# Altium footprint library HW_HOLLAND_NCDM_MONITOR_R1.PcbLib: 472 footprints (part 2 of 30)
Each footprint in its own frame and in the unit in brackets; x right, y up, seen from the top. Pads: shape width x height; smd on the part's side, far side on the other; paste and mask are expansions set on the pad; w line width, h text height; cw(c..) or ccw(c..) is an arc to the next point about the centre after c.
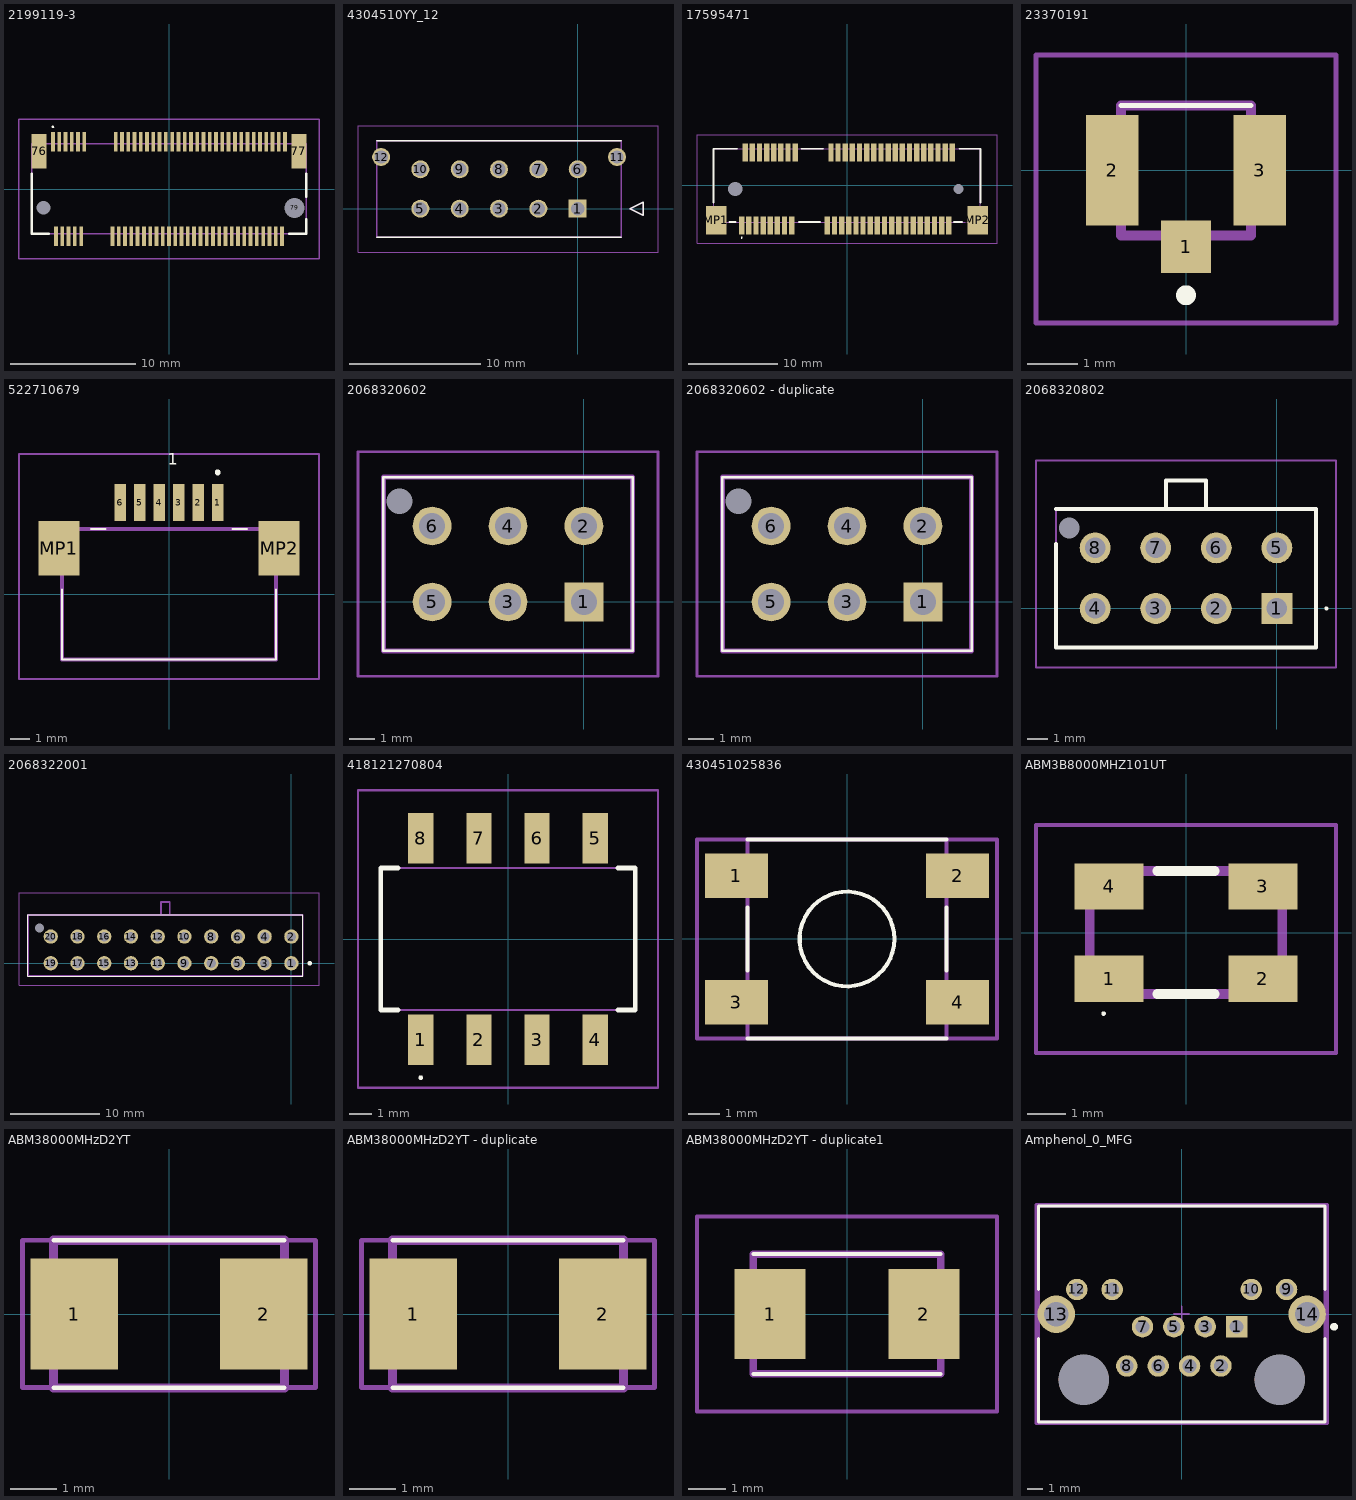
[diagram p1: the footprints below, top view; thin cyan lines are the x and y axes]

## 2199119-3 [mm]
pads (71):
  rect 0.3x1.55 smd: 1(-9.25,3.775) 2(-9,-3.775) 3(-8.75,3.775) 4(-8.5,-3.775) 5(-8.25,3.775) 6(-8,-3.775) 7(-7.75,3.775) 8(-7.5,-3.775) 9(-7.25,3.775) 10(-7,-3.775) 11(-6.75,3.775) 20(-4.5,-3.775) 21(-4.25,3.775) 22(-4,-3.775) 23(-3.75,3.775) 24(-3.5,-3.775) 25(-3.25,3.775) 26(-3,-3.775) 27(-2.75,3.775) 28(-2.5,-3.775) 29(-2.25,3.775) 30(-2,-3.775) 31(-1.75,3.775) 32(-1.5,-3.775) 33(-1.25,3.775) 34(-1,-3.775) 35(-0.75,3.775) 36(-0.5,-3.775) 37(-0.25,3.775) 38(0,-3.775) 39(0.25,3.775) 40(0.5,-3.775) 41(0.75,3.775) 42(1,-3.775) 43(1.25,3.775) 44(1.5,-3.775) 45(1.75,3.775) 46(2,-3.775) 47(2.25,3.775) 48(2.5,-3.775) 49(2.75,3.775) 50(3,-3.775) 51(3.25,3.775) 52(3.5,-3.775) 53(3.75,3.775) 54(4,-3.775) 55(4.25,3.775) 56(4.5,-3.775) 57(4.75,3.775) 58(5,-3.775) 59(5.25,3.775) 60(5.5,-3.775) 61(5.75,3.775) 62(6,-3.775) 63(6.25,3.775) 64(6.5,-3.775) 65(6.75,3.775) 66(7,-3.775) 67(7.25,3.775) 68(7.5,-3.775) 69(7.75,3.775) 70(8,-3.775) 71(8.25,3.775) 72(8.5,-3.775) 73(8.75,3.775) 74(9,-3.775) 75(9.25,3.775)
  rect 1.2x2.75 smd: 76(-10.35,3) 77(10.35,3)
  round 0.55 hole 1.1 unplated: 78(-10,-1.5)
  round 0.8 hole 1.6 unplated: 79(10,-1.5)
Top Overlay:
  lines w0.1: -9.25,4.9 cw(c-9.25,4.95) -9.25,5 cw(c-9.25,4.95) -9.25,4.9
  lines w0.2: -10.925,1.2 -10.925,-3.55 -9.6,-3.55 ; 9.6,-3.55 10.925,-3.55 10.925,-2.4 ; 10.925,-0.6 10.925,1.2
Mechanical 13:
  lines w0.1: -10.925,-3.55 -10.925,3.6 10.925,3.6 10.925,-3.55 -10.925,-3.55
Mechanical 15:
  lines w0.1: -11.95,-5.55 -11.95,5.55 11.95,5.55 11.95,-5.55 -11.95,-5.55
3D body "EM05--3DModel-STEP-269445.STEP": height 3.8, standoff 1.5, extent -15,-41.416 15,0.584
3D body "Conn_TE_Connectivity_2199119-3_eec.STEP": height 0.25, standoff 0, extent -11.1,-4.65 11.1,4.65

## 4304510YY_12 [mm]
pads (12):
  rect 1.37x1.37 / inner round 1.37 / far side rect 1.37x1.37 hole 1.02 mask+0.076: 1(0,0)
  round 1.37 hole 1.02 mask+0.076: 2(-3,0) 3(-6,0) 4(-9,0) 5(-12,0) 6(0,3) 7(-3,3) 8(-6,3) 9(-9,3) 10(-12,3) 11(3,3.94) 12(-15,3.94)
Top Overlay:
  lines w0.127: -15.325,-2.185 3.325,-2.185 ; -15.325,5.185 3.325,5.185 ; 4,0 5,0.5 5,-0.5 4,0
Mechanical 15:
  lines w0.127: -15.325,-2.185 -15.325,5.185 3.325,5.185 3.325,-2.185 -15.325,-2.185 ; 4,0 5,0.5 5,-0.5 4,0
Mechanical 20:
  lines w0.05: -16.761,-3.312 -16.761,6.312 6.127,6.312 6.127,-3.312 -16.761,-3.312
3D body "430451012.stp": height 9.95, standoff -3.14, extent -15.575,-2.47 3.575,6.3

## 17595471 [mm]
pads (56):
  rect 0.6x2 smd: 1(-11.8,-4.5) 2(-11.4,3.7) 3(-11,-4.5) 4(-10.6,3.7) 5(-10.2,-4.5) 6(-9.8,3.7) 7(-9.4,-4.5) 8(-9,3.7) 9(-8.6,-4.5) 10(-8.2,3.7) 11(-7.8,-4.5) 12(-7.4,3.7) 13(-7,-4.5) 14(-6.6,3.7) 15(-6.2,-4.5) 16(-5.8,3.7) 17(-2.2,-4.5) 18(-1.8,3.7) 19(-1.4,-4.5) 20(-1,3.7) 21(-0.6,-4.5) 22(-0.2,3.7) 23(0.2,-4.5) 24(0.6,3.7) 25(1,-4.5) 26(1.4,3.7) 27(1.8,-4.5) 28(2.2,3.7) 29(2.6,-4.5) 30(3,3.7) 31(3.4,-4.5) 32(3.8,3.7) 33(4.2,-4.5) 34(4.6,3.7) 35(5,-4.5) 36(5.4,3.7) 37(5.8,-4.5) 38(6.2,3.7) 39(6.6,-4.5) 40(7,3.7) 41(7.4,-4.5) 42(7.8,3.7) 43(8.2,-4.5) 44(8.6,3.7) 45(9,-4.5) 46(9.4,3.7) 47(9.8,-4.5) 48(10.2,3.7) 49(10.6,-4.5) 50(11,3.7) 51(11.4,-4.5) 52(11.8,3.7)
  round 0.8 hole 1.6 unplated: MH1(-12.5,-0.4)
  round 0.55 hole 1.1 unplated: MH2(12.5,-0.4)
  rect 2.3x3.2 smd: MP1(-14.65,-3.9) MP2(14.65,-3.9)
Top Overlay:
  lines w0.1: -11.8,-5.9 cw(c-11.8,-5.85) -11.8,-5.8 cw(c-11.8,-5.85) -11.8,-5.9
  lines w0.2: -14.95,-1.9 -14.95,4.1 -12.3,4.1 ; -13.2,-4.1 -12.5,-4.1 ; -5.4,-4.1 -3,-4.1 ; -5.1,4.1 -2.7,4.1 ; 12,-4.1 12.9,-4.1 ; 12.6,4.1 14.95,4.1 14.95,-1.9
Mechanical 13:
  lines w0.1: -14.95,-4.1 14.95,-4.1 14.95,4.1 -14.95,4.1 -14.95,-4.1
Mechanical 15:
  lines w0.1: -16.8,-6.5 16.8,-6.5 16.8,5.7 -16.8,5.7 -16.8,-6.5
3D body "1759547-1.stp": height 7.01, standoff -0.64, extent -14.95,-5 14.95,4.1

## 23370191 [mm]
pads (3):
  rect 1x1.05 smd: 1(0,-1.525)
  rect 1.05x2.2 smd: 2(-1.475,0) 3(1.475,0)
Top Overlay:
  lines w0.1: -1.3,1.3 1.3,1.3
  lines w0.2: -0.1,-2.5 ccw(c0,-2.5) 0.1,-2.5 ccw(c0,-2.5) -0.1,-2.5
Mechanical 13:
  lines w0.2: -1.3,-1.3 1.3,-1.3 1.3,1.3 -1.3,1.3 -1.3,-1.3
Mechanical 15:
  lines w0.1: -3,-3.05 3,-3.05 3,2.3 -3,2.3 -3,-3.05
3D body "2337019-1.stp": height 1.25, standoff 0, extent -1.5,-1.46 1.5,1.64

## 522710679 [mm]
pads (8):
  rect 0.6x1.9 smd: 1(2.5,4.7) 2(1.5,4.7) 3(0.5,4.7) 4(-0.5,4.7) 5(-1.5,4.7) 6(-2.5,4.7)
  rect 2.1x2.8 smd: MP1(-5.65,2.35) MP2(5.65,2.35)
Top Overlay:
  lines w0.1: -5.5,-3.35 5.5,-3.35 ; -5.5,-3.35 5.5,-3.35 ; -5.5,-3.35 -5.5,0.25 -5.5,-3.35 ; 5.5,-3.35 5.5,0.25 5.5,-3.35 ; -4,3.35 -3.25,3.35 -4,3.35 ; 3.25,3.35 4,3.35 3.25,3.35
  lines w0.2: 2.5,6.2 cw(c2.5,6.25) 2.5,6.3 ; 2.5,6.2 ccw(c2.5,6.25) 2.5,6.3 ; 2.5,6.2 cw(c2.5,6.25) 2.5,6.3
  text "1" at -0.074,6.428 h1.02
Mechanical 13:
  lines w0.2: -5.5,-3.35 -5.5,3.35 5.5,3.35 5.5,-3.35 -5.5,-3.35
Mechanical 15:
  lines w0.1: -7.7,-4.35 -7.7,7.2 7.7,7.2 7.7,-4.35 -7.7,-4.35
3D body "52271-0679.stp": height 3, standoff 0, extent -6.5,-2.27 6.5,5.13

## 2068320602 [mm]
pads (7):
  rect 1.53x1.53 hole 1.02: 1(0,0)
  round 1.53 hole 1.02: 2(0,3) 3(-3,0) 4(-3,3) 5(-6,0) 6(-6,3)
  round 0.51 hole 1.02 unplated: MH1(-7.28,3.98)
Top Overlay:
  lines w0.1: -7.925,-1.93 1.925,-1.93 1.925,4.93 -7.925,4.93 -7.925,-1.93
Mechanical 15:
  lines w0.2: -7.925,-1.93 1.925,-1.93 1.925,4.93 -7.925,4.93 -7.925,-1.93
Mechanical 20:
  lines w0.1: -8.925,-2.93 2.925,-2.93 2.925,5.93 -8.925,5.93 -8.925,-2.93
3D body "206832-0602.stp": height 5.8, standoff -4.65, extent -10,-3.376 10,3.376

## 2068320602 - duplicate [mm]
pads (7):
  rect 1.53x1.53 hole 1.02: 1(0,0)
  round 1.53 hole 1.02: 2(0,3) 3(-3,0) 4(-3,3) 5(-6,0) 6(-6,3)
  round 0.51 hole 1.02 unplated: MH1(-7.28,3.98)
Top Overlay:
  lines w0.1: -7.925,-1.93 1.925,-1.93 1.925,4.93 -7.925,4.93 -7.925,-1.93
Mechanical 15:
  lines w0.2: -7.925,-1.93 1.925,-1.93 1.925,4.93 -7.925,4.93 -7.925,-1.93
Mechanical 20:
  lines w0.1: -8.925,-2.93 2.925,-2.93 2.925,5.93 -8.925,5.93 -8.925,-2.93
3D body "206832-0602.stp": height 5.8, standoff -4.65, extent -10,-3.376 10,3.376

## 2068320802 [mm]
pads (9):
  rect 1.53x1.53 hole 1.02: 1(0,0)
  round 1.53 hole 1.02: 2(-3,0) 3(-6,0) 4(-9,0) 5(0,3) 6(-3,3) 7(-6,3) 8(-9,3)
  round 0.51 hole 1.02 unplated: MH1(-10.28,3.98)
Top Overlay:
  lines w0.1: 2.4,0 cw(c2.45,0) 2.5,0 cw(c2.45,0) 2.4,0
  lines w0.2: -10.925,3.2 -10.925,-1.93 1.925,-1.93 1.925,4.93 -10.925,4.93 ; -5.5,4.93 -5.5,6.33 -3.5,6.33 -3.5,4.93
Mechanical 13:
  lines w0.1: -5.5,4.93 -5.5,6.33 -3.5,6.33 -3.5,4.93 ; -10.925,-1.93 -10.925,4.93 1.925,4.93 1.925,-1.93 -10.925,-1.93
Mechanical 15:
  lines w0.1: -11.925,-2.93 -11.925,7.33 2.925,7.33 2.925,-2.93 -11.925,-2.93
3D body "206832-0802.stp": height 9.8, standoff -3.28, extent -10.925,-1.93 1.925,6.33

## 2068322001 [mm]
pads (21):
  round 1.605 hole 1.07: 1(0,0) 2(0,3) 3(-3,0) 4(-3,3) 5(-6,0) 6(-6,3) 7(-9,0) 8(-9,3) 9(-12,0) 10(-12,3) 11(-15,0) 12(-15,3) 13(-18,0) 14(-18,3) 15(-21,0) 16(-21,3) 17(-24,0) 18(-24,3) 19(-27,0) 20(-27,3)
  round 0.51 hole 1.02 unplated: MH1(-28.28,3.98)
Top Overlay:
  lines w0.1: -29.565,-1.44 1.285,-1.44 1.285,5.42 -29.565,5.42 -29.565,-1.44
  lines w0.4: 2,0 ccw(c2.05,0) 2.1,0 ccw(c2.05,0) 2,0
Mechanical 13:
  lines w0.2: -14.64,5.49 -14.64,6.89 -13.64,6.89 -13.64,5.42 ; -29.565,-1.44 1.285,-1.44 1.285,5.42 -29.565,5.42 -29.565,-1.44
Mechanical 15:
  lines w0.1: -30.565,-2.44 3.1,-2.44 3.1,7.89 -30.565,7.89 -30.565,-2.44
3D body "2068322001--3DModel-STEP-361473.STEP": height 9.92, standoff -3.17, extent -28.925,-1.935 1.925,6.325

## 418121270804 [mm]
pads (8):
  rect 1.1x2.2 smd: 1(-3.81,-4.4) 2(-1.27,-4.4) 3(1.27,-4.4) 4(3.81,-4.4) 5(3.81,4.4) 6(1.27,4.4) 7(-1.27,4.4) 8(-3.81,4.4)
Top Overlay:
  lines w0.1: -3.81,-6.1 ccw(c-3.81,-6.05) -3.81,-6 ccw(c-3.81,-6.05) -3.81,-6.1
  lines w0.2: -4.8,-3.1 -5.55,-3.1 -5.55,3.1 -4.8,3.1 ; 4.8,-3.1 5.55,-3.1 5.55,3.1 4.8,3.1
Mechanical 13:
  lines w0.1: -5.55,-3.1 -5.55,3.1 5.55,3.1 5.55,-3.1 -5.55,-3.1
Mechanical 15:
  lines w0.1: -6.55,-6.5 -6.55,6.5 6.55,6.5 6.55,-6.5 -6.55,-6.5
3D body "418121270804.stp": height 4.32, standoff 0, extent -5.55,-4.9 5.55,4.9

## 430451025836 [mm]
pads (4):
  rect 2x1.4 smd: 1(-3.5,2) 2(3.5,2) 3(-3.5,-2) 4(3.5,-2)
Top Overlay:
  circle w0.127: c0,0 r1.5
  lines w0.127: -3.15,-3.15 3.15,-3.15 ; -3.15,-1 -3.15,1 ; -3.15,3.15 1.3,3.15 3.15,3.15 ; 3.15,-1 3.15,1
Mechanical 13:
  lines w0.127: -3.15,-3.15 3.15,-3.15 3.15,3.15 -3.15,3.15 -3.15,-3.15
Mechanical 15:
  lines w0.127: -4.75,-3.15 -4.75,3.15 4.75,3.15 4.75,-3.15 -4.75,-3.15
3D body "4304x10258x6.stp": height 2.49, standoff -0.01, extent -4,-3.1 4,3.1

## ABM3B8000MHZ101UT [mm]
pads (4):
  rect 1.8x1.2 smd: 1(-2,-1.2) 2(2,-1.2) 3(2,1.2) 4(-2,1.2)
Top Overlay:
  lines w0.059: -2.171,-2.106 ccw(c-2.141,-2.106) -2.111,-2.106 ccw(c-2.141,-2.106) -2.171,-2.106
  lines w0.254: -0.75,-1.6 0.75,-1.6 ; -0.75,1.6 0.75,1.6
Mechanical 13:
  lines w0.254: -2.5,-1.6 2.5,-1.6 2.5,1.6 -2.5,1.6 -2.5,-1.6
Mechanical 15:
  lines w0.1: -3.9,-3.136 3.9,-3.136 3.9,2.8 -3.9,2.8 -3.9,-3.136
3D body "ABM3B-25.000MHZ-D4Y-T.stp": height 1.1, standoff 0, extent -2.5,-1.6 2.5,1.6

## ABM38000MHzD2YT [mm]
height 3.5
pads (2):
  rect 1.9x2.4 smd: 1(-2.05,0) 2(2.05,0)
Top Overlay:
  lines w0.1: -2.5,-1.6 2.5,-1.6 ; -2.5,1.6 2.5,1.6
Mechanical 13:
  lines w0.2: -2.5,-1.6 2.5,-1.6 2.5,1.6 -2.5,1.6 -2.5,-1.6
Mechanical 15:
  lines w0.1: -3.175,-1.592 3.175,-1.592 3.175,1.603 -3.175,1.603 -3.175,-1.592
3D body "ABM3-8.000MHZ-B4Y-T.stp": height 1.3, standoff 0, extent -2.5,-1.6 2.5,1.6

## ABM38000MHzD2YT - duplicate [mm]
height 3.5
pads (2):
  rect 1.9x2.4 smd: 1(-2.05,0) 2(2.05,0)
Top Overlay:
  lines w0.1: -2.5,-1.6 2.5,-1.6 ; -2.5,1.6 2.5,1.6
Mechanical 13:
  lines w0.2: -2.5,-1.6 2.5,-1.6 2.5,1.6 -2.5,1.6 -2.5,-1.6
Mechanical 15:
  lines w0.1: -3.175,-1.592 3.175,-1.592 3.175,1.603 -3.175,1.603 -3.175,-1.592
3D body "ABM3-8.000MHZ-B4Y-T.stp": height 1.3, standoff 0, extent -2.5,-1.6 2.5,1.6

## ABM38000MHzD2YT - duplicate1 [mm]
height 0.52
pads (2):
  rect 1.9x2.4 smd: 1(-2.05,0) 2(2.05,0)
Top Overlay:
  lines w0.1: -2.5,-1.6 2.5,-1.6 ; -2.5,1.6 2.5,1.6
Mechanical 13:
  lines w0.2: -2.5,-1.6 2.5,-1.6 2.5,1.6 -2.5,1.6 -2.5,-1.6
Mechanical 15:
  lines w0.1: -4,-2.6 4,-2.6 4,2.6 -4,2.6 -4,-2.6
3D body "ABM3-8.000MHZ-B4Y-T.stp": height 1.3, standoff 0, extent -2.5,-1.6 2.5,1.6

## Amphenol_0_MFG [mil]
pads (16):
  rect 54.69x54.69 hole 35 paste-99999 mask+0: 1(140,-32.5)
  round 54.69 hole 35 paste-99999 mask+0: 2(100,-132.5) 3(60,-32.5) 4(20,-132.5) 5(-20,-32.5) 6(-60,-132.5) 7(-100,-32.5) 8(-140,-132.5) 9(267.5,62.5) 10(177.5,62.5) 11(-177.5,62.5) 12(-267.5,62.5)
  round 95.46 hole 62 paste-99999 mask+0: 13(-320,-0.5) 14(320,-0.5)
  round 128 hole 128 unplated paste-99999 mask+0: ""(-250,-167.5) ""(250,-167.5)
Top Overlay:
  circle w9.84: c388.62,-32.5 r4.92
  lines w7.87: -365,-63 -365,-275 365,-275 365,-63 ; -365,62 -365,275 365,275 365,62
Top Courtyard:
  lines w7.87: -371.67,-278.94 371.67,-278.94 371.67,278.94 -371.67,278.94 -371.67,-278.94
  text ".Designator" at 0,9.24 h49.21
Mechanical 12:
  lines w7.87: -365,-275 365,-275 365,275 -365,275 -365,-275
Mechanical 15:
  lines w3.94: -19.68,0 19.68,0 ; 0,-19.68 0,19.68
  lines w7.87: -371.67,-278.94 371.67,-278.94 371.67,278.94 -371.67,278.94 -371.67,-278.94
3D body "Conn_Amphenol_RJHSE-3381_eec.STEP": height 10, standoff 0, extent -371.67,-278.94 371.67,278.94